# Altium schematic symbol library jlcpcb_2025_04_resistors_extended_2010.schlib: 1697 symbols (part 5 of 9) (continued)
## CR2010J20240G
designator R?  Resistance: 24Ω  (hidden comment: *)
Resistor, 24Ω, ±5%, 200V, SMD 2010; Manufacturer: Uniroyal; Manufacturer Part Number: CR2010J20240G; Supplier 1: LCSC; Supplier Part Number 1: C3037911; JLCPCB Part Number: C3037911; Category: Resistors; Package Size: 2010; JLCPCB Basic Part: Yes; Tolerance: ±5%; Voltage Rating: 200V; ComponentLink1Description: Datasheet; ComponentLink1URL: https://wmsc.lcsc.com/wmsc/upload/file/pdf/v2/lcsc/2206161815_LIZ-Elec-CR2010J20240G_C3037911.pdf; ComponentLink2Description: JLCPCB Part URL; ComponentLink2URL: https://jlcpcb.com/partdetail/C3037911
pins: 1, 2
1 alternate drawing of the same symbol

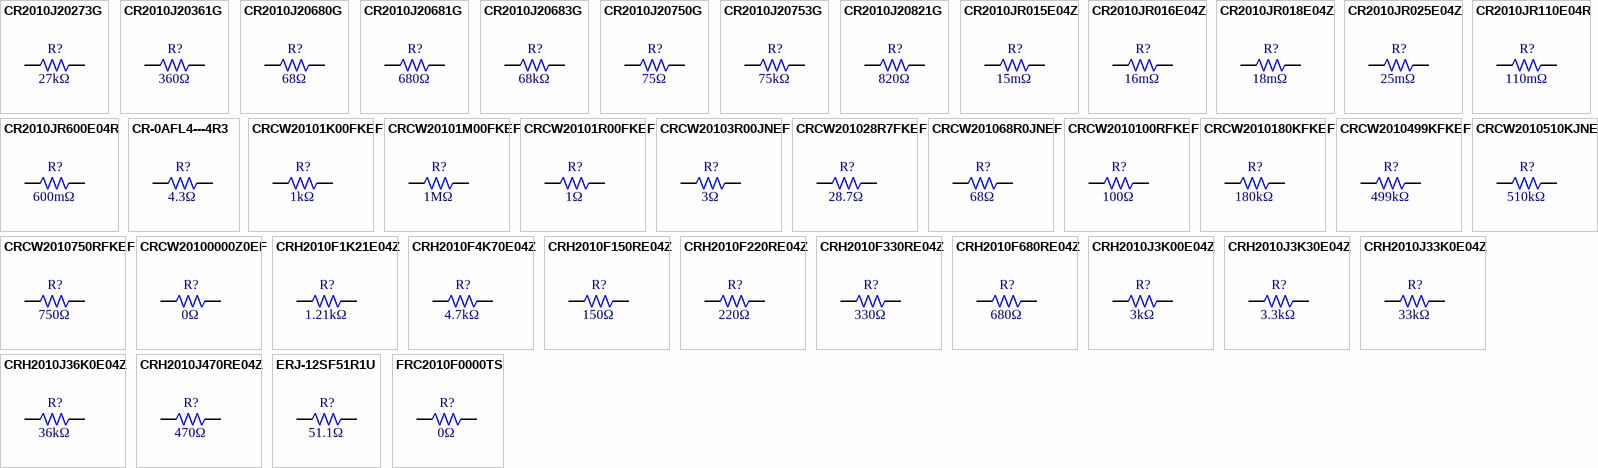
[diagram p22: symbols CR2010J20273G to FRC2010F0000TS]

## CR2010J20273G
designator R?  Resistance: 27kΩ  (hidden comment: *)
Resistor, 27kΩ, ±5%, 200V, SMD 2010; Manufacturer: Uniroyal; Manufacturer Part Number: CR2010J20273G; Supplier 1: LCSC; Supplier Part Number 1: C3036846; JLCPCB Part Number: C3036846; Category: Resistors; Package Size: 2010; JLCPCB Basic Part: Yes; Tolerance: ±5%; Voltage Rating: 200V; ComponentLink1Description: Datasheet; ComponentLink1URL: https://wmsc.lcsc.com/wmsc/upload/file/pdf/v2/lcsc/2206222045_LIZ-Elec-CR2010J20273G_C3036846.pdf; ComponentLink2Description: JLCPCB Part URL; ComponentLink2URL: https://jlcpcb.com/partdetail/C3036846
pins: 1, 2
1 alternate drawing of the same symbol

## CR2010J20361G
designator R?  Resistance: 360Ω  (hidden comment: *)
Resistor, 360Ω, ±5%, 200V, SMD 2010; Manufacturer: Uniroyal; Manufacturer Part Number: CR2010J20361G; Supplier 1: LCSC; Supplier Part Number 1: C3036878; JLCPCB Part Number: C3036878; Category: Resistors; Package Size: 2010; JLCPCB Basic Part: Yes; Tolerance: ±5%; Voltage Rating: 200V; ComponentLink1Description: Datasheet; ComponentLink1URL: https://wmsc.lcsc.com/wmsc/upload/file/pdf/v2/lcsc/2206301715_LIZ-Elec-CR2010J20361G_C3036878.pdf; ComponentLink2Description: JLCPCB Part URL; ComponentLink2URL: https://jlcpcb.com/partdetail/C3036878
pins: 1, 2
1 alternate drawing of the same symbol

## CR2010J20680G
designator R?  Resistance: 68Ω  (hidden comment: *)
Resistor, 68Ω, ±5%, 500mW, 200V, ±200ppm/℃, -55℃~+125℃, SMD 2010; Manufacturer: Uniroyal; Manufacturer Part Number: CR2010J20680G; Supplier 1: LCSC; Supplier Part Number 1: C102509; JLCPCB Part Number: C102509; Power Rating: 500mW; Category: Resistors; Package Size: 2010; JLCPCB Basic Part: Yes; Tolerance: ±5%; Voltage Rating: 200V; Temperature Coefficient: ±200ppm/℃; Temperature Rating: -55℃~+125℃; ComponentLink1Description: Datasheet; ComponentLink1URL: https://wmsc.lcsc.com/wmsc/upload/file/pdf/v2/lcsc/2304140030_LIZ-Elec-CR2010J20680G_C102509.pdf; ComponentLink2Description: JLCPCB Part URL; ComponentLink2URL: https://jlcpcb.com/partdetail/C102509
pins: 1, 2
1 alternate drawing of the same symbol

## CR2010J20681G
designator R?  Resistance: 680Ω  (hidden comment: *)
Resistor, 680Ω, ±5%, 500mW, 200V, ±200ppm/℃, -55℃~+125℃, SMD 2010; Manufacturer: Uniroyal; Manufacturer Part Number: CR2010J20681G; Supplier 1: LCSC; Supplier Part Number 1: C102510; JLCPCB Part Number: C102510; Power Rating: 500mW; Category: Resistors; Package Size: 2010; JLCPCB Basic Part: Yes; Tolerance: ±5%; Voltage Rating: 200V; Temperature Coefficient: ±200ppm/℃; Temperature Rating: -55℃~+125℃; ComponentLink1Description: Datasheet; ComponentLink1URL: https://wmsc.lcsc.com/wmsc/upload/file/pdf/v2/lcsc/2304140030_LIZ-Elec-CR2010J20681G_C102510.pdf; ComponentLink2Description: JLCPCB Part URL; ComponentLink2URL: https://jlcpcb.com/partdetail/C102510
pins: 1, 2
1 alternate drawing of the same symbol

## CR2010J20683G
designator R?  Resistance: 68kΩ  (hidden comment: *)
Resistor, 68kΩ, ±5%, 500mW, 200V, ±200ppm/℃, -55℃~+125℃, SMD 2010; Manufacturer: Uniroyal; Manufacturer Part Number: CR2010J20683G; Supplier 1: LCSC; Supplier Part Number 1: C102511; JLCPCB Part Number: C102511; Power Rating: 500mW; Category: Resistors; Package Size: 2010; JLCPCB Basic Part: Yes; Tolerance: ±5%; Voltage Rating: 200V; Temperature Coefficient: ±200ppm/℃; Temperature Rating: -55℃~+125℃; ComponentLink1Description: Datasheet; ComponentLink1URL: https://wmsc.lcsc.com/wmsc/upload/file/pdf/v2/lcsc/2304140030_LIZ-Elec-CR2010J20683G_C102511.pdf; ComponentLink2Description: JLCPCB Part URL; ComponentLink2URL: https://jlcpcb.com/partdetail/C102511
pins: 1, 2
1 alternate drawing of the same symbol

## CR2010J20750G
designator R?  Resistance: 75Ω  (hidden comment: *)
Resistor, 75Ω, ±5%, 500mW, 200V, ±200ppm/℃, -55℃~+125℃, SMD 2010; Manufacturer: Uniroyal; Manufacturer Part Number: CR2010J20750G; Supplier 1: LCSC; Supplier Part Number 1: C102512; JLCPCB Part Number: C102512; Power Rating: 500mW; Category: Resistors; Package Size: 2010; JLCPCB Basic Part: Yes; Tolerance: ±5%; Voltage Rating: 200V; Temperature Coefficient: ±200ppm/℃; Temperature Rating: -55℃~+125℃; ComponentLink1Description: Datasheet; ComponentLink1URL: https://wmsc.lcsc.com/wmsc/upload/file/pdf/v2/lcsc/2304140030_LIZ-Elec-CR2010J20750G_C102512.pdf; ComponentLink2Description: JLCPCB Part URL; ComponentLink2URL: https://jlcpcb.com/partdetail/C102512
pins: 1, 2
1 alternate drawing of the same symbol

## CR2010J20753G
designator R?  Resistance: 75kΩ  (hidden comment: *)
Resistor, 75kΩ, ±5%, 500mW, 200V, ±200ppm/℃, -55℃~+125℃, SMD 2010; Manufacturer: Uniroyal; Manufacturer Part Number: CR2010J20753G; Supplier 1: LCSC; Supplier Part Number 1: C102514; JLCPCB Part Number: C102514; Power Rating: 500mW; Category: Resistors; Package Size: 2010; JLCPCB Basic Part: Yes; Tolerance: ±5%; Voltage Rating: 200V; Temperature Coefficient: ±200ppm/℃; Temperature Rating: -55℃~+125℃; ComponentLink1Description: Datasheet; ComponentLink1URL: https://wmsc.lcsc.com/wmsc/upload/file/pdf/v2/lcsc/2304140030_LIZ-Elec-CR2010J20753G_C102514.pdf; ComponentLink2Description: JLCPCB Part URL; ComponentLink2URL: https://jlcpcb.com/partdetail/C102514
pins: 1, 2
1 alternate drawing of the same symbol

## CR2010J20821G
designator R?  Resistance: 820Ω  (hidden comment: *)
Resistor, 820Ω, ±5%, 500mW, 200V, ±200ppm/℃, -55℃~+125℃, SMD 2010; Manufacturer: Uniroyal; Manufacturer Part Number: CR2010J20821G; Supplier 1: LCSC; Supplier Part Number 1: C102516; JLCPCB Part Number: C102516; Power Rating: 500mW; Category: Resistors; Package Size: 2010; JLCPCB Basic Part: Yes; Tolerance: ±5%; Voltage Rating: 200V; Temperature Coefficient: ±200ppm/℃; Temperature Rating: -55℃~+125℃; ComponentLink1Description: Datasheet; ComponentLink1URL: https://wmsc.lcsc.com/wmsc/upload/file/pdf/v2/lcsc/2304140030_LIZ-Elec-CR2010J20821G_C102516.pdf; ComponentLink2Description: JLCPCB Part URL; ComponentLink2URL: https://jlcpcb.com/partdetail/C102516
pins: 1, 2
1 alternate drawing of the same symbol

## CR2010JR015E04Z
designator R?  Resistance: 15mΩ  (hidden comment: *)
Resistor, 15mΩ, ±5%, 750mW, 200V, -55℃~+155℃, SMD 2010; Manufacturer: Uniroyal; Manufacturer Part Number: CR2010JR015E04Z; Supplier 1: LCSC; Supplier Part Number 1: C165361; JLCPCB Part Number: C165361; Power Rating: 750mW; Category: Resistors; Package Size: 2010; JLCPCB Basic Part: Yes; Tolerance: ±5%; Voltage Rating: 200V; Temperature Rating: -55℃~+155℃; ComponentLink1Description: Datasheet; ComponentLink1URL: https://wmsc.lcsc.com/wmsc/upload/file/pdf/v2/lcsc/2304140030_Ever-Ohms-Tech-CR2010JR015E04Z_C165361.pdf; ComponentLink2Description: JLCPCB Part URL; ComponentLink2URL: https://jlcpcb.com/partdetail/C165361
pins: 1, 2
1 alternate drawing of the same symbol

## CR2010JR016E04Z
designator R?  Resistance: 16mΩ  (hidden comment: *)
Resistor, 16mΩ, ±5%, 750mW, 200V, -55℃~+155℃, SMD 2010; Manufacturer: Uniroyal; Manufacturer Part Number: CR2010JR016E04Z; Supplier 1: LCSC; Supplier Part Number 1: C165360; JLCPCB Part Number: C165360; Power Rating: 750mW; Category: Resistors; Package Size: 2010; JLCPCB Basic Part: Yes; Tolerance: ±5%; Voltage Rating: 200V; Temperature Rating: -55℃~+155℃; ComponentLink1Description: Datasheet; ComponentLink1URL: https://wmsc.lcsc.com/wmsc/upload/file/pdf/v2/lcsc/2304140030_Ever-Ohms-Tech-CR2010JR016E04Z_C165360.pdf; ComponentLink2Description: JLCPCB Part URL; ComponentLink2URL: https://jlcpcb.com/partdetail/C165360
pins: 1, 2
1 alternate drawing of the same symbol

## CR2010JR018E04Z
designator R?  Resistance: 18mΩ  (hidden comment: *)
Resistor, 18mΩ, ±5%, 750mW, 200V, -55℃~+155℃, SMD 2010; Manufacturer: Uniroyal; Manufacturer Part Number: CR2010JR018E04Z; Supplier 1: LCSC; Supplier Part Number 1: C165359; JLCPCB Part Number: C165359; Power Rating: 750mW; Category: Resistors; Package Size: 2010; JLCPCB Basic Part: Yes; Tolerance: ±5%; Voltage Rating: 200V; Temperature Rating: -55℃~+155℃; ComponentLink1Description: Datasheet; ComponentLink1URL: https://wmsc.lcsc.com/wmsc/upload/file/pdf/v2/lcsc/2304140030_Ever-Ohms-Tech-CR2010JR018E04Z_C165359.pdf; ComponentLink2Description: JLCPCB Part URL; ComponentLink2URL: https://jlcpcb.com/partdetail/C165359
pins: 1, 2
1 alternate drawing of the same symbol

## CR2010JR025E04Z
designator R?  Resistance: 25mΩ  (hidden comment: *)
Resistor, 25mΩ, ±5%, 750mW, 200V, -55℃~+155℃, SMD 2010; Manufacturer: Uniroyal; Manufacturer Part Number: CR2010JR025E04Z; Supplier 1: LCSC; Supplier Part Number 1: C165358; JLCPCB Part Number: C165358; Power Rating: 750mW; Category: Resistors; Package Size: 2010; JLCPCB Basic Part: Yes; Tolerance: ±5%; Voltage Rating: 200V; Temperature Rating: -55℃~+155℃; ComponentLink1Description: Datasheet; ComponentLink1URL: https://wmsc.lcsc.com/wmsc/upload/file/pdf/v2/lcsc/2304140030_Ever-Ohms-Tech-CR2010JR025E04Z_C165358.pdf; ComponentLink2Description: JLCPCB Part URL; ComponentLink2URL: https://jlcpcb.com/partdetail/C165358
pins: 1, 2
1 alternate drawing of the same symbol

## CR2010JR110E04R
designator R?  Resistance: 110mΩ  (hidden comment: *)
Resistor, 110mΩ, ±5%, 750mW, 200V, -55℃~+155℃, SMD 2010; Manufacturer: Uniroyal; Manufacturer Part Number: CR2010JR110E04R; Supplier 1: LCSC; Supplier Part Number 1: C165353; JLCPCB Part Number: C165353; Power Rating: 750mW; Category: Resistors; Package Size: 2010; JLCPCB Basic Part: Yes; Tolerance: ±5%; Voltage Rating: 200V; Temperature Rating: -55℃~+155℃; ComponentLink1Description: Datasheet; ComponentLink1URL: https://wmsc.lcsc.com/wmsc/upload/file/pdf/v2/lcsc/2304140030_Ever-Ohms-Tech-CR2010JR110E04R_C165353.pdf; ComponentLink2Description: JLCPCB Part URL; ComponentLink2URL: https://jlcpcb.com/partdetail/C165353
pins: 1, 2
1 alternate drawing of the same symbol

## CR2010JR600E04R
designator R?  Resistance: 600mΩ  (hidden comment: *)
Resistor, 600mΩ, ±5%, 750mW, 200V, -55℃~+155℃, SMD 2010; Manufacturer: Uniroyal; Manufacturer Part Number: CR2010JR600E04R; Supplier 1: LCSC; Supplier Part Number 1: C165349; JLCPCB Part Number: C165349; Power Rating: 750mW; Category: Resistors; Package Size: 2010; JLCPCB Basic Part: Yes; Tolerance: ±5%; Voltage Rating: 200V; Temperature Rating: -55℃~+155℃; ComponentLink1Description: Datasheet; ComponentLink1URL: https://wmsc.lcsc.com/wmsc/upload/file/pdf/v2/lcsc/2304140030_Ever-Ohms-Tech-CR2010JR600E04R_C165349.pdf; ComponentLink2Description: JLCPCB Part URL; ComponentLink2URL: https://jlcpcb.com/partdetail/C165349
pins: 1, 2
1 alternate drawing of the same symbol

## CR-0AFL4---4R3
designator R?  Resistance: 4.3Ω  (hidden comment: *)
Resistor, 4.3Ω, ±1%, 750mW, 200V, ±200ppm/℃, -55℃~+155℃, SMD 2010; Manufacturer: Uniroyal; Manufacturer Part Number: CR-0AFL4---4R3; Supplier 1: LCSC; Supplier Part Number 1: C468526; JLCPCB Part Number: C468526; Power Rating: 750mW; Category: Resistors; Package Size: 2010; JLCPCB Basic Part: Yes; Tolerance: ±1%; Voltage Rating: 200V; Temperature Coefficient: ±200ppm/℃; Temperature Rating: -55℃~+155℃; ComponentLink1Description: Datasheet; ComponentLink1URL: https://wmsc.lcsc.com/wmsc/upload/file/pdf/v2/lcsc/2304140030_Viking-Tech-CR-0AFL4---4R3_C468526.pdf; ComponentLink2Description: JLCPCB Part URL; ComponentLink2URL: https://jlcpcb.com/partdetail/C468526
pins: 1, 2
1 alternate drawing of the same symbol

## CRCW20101K00FKEF
designator R?  Resistance: 1kΩ  (hidden comment: *)
Resistor, 1kΩ, ±1%, 750mW, ±100ppm/℃, -55℃~+155℃, SMD 2010; Manufacturer: Uniroyal; Manufacturer Part Number: CRCW20101K00FKEF; Supplier 1: LCSC; Supplier Part Number 1: C844445; JLCPCB Part Number: C844445; Power Rating: 750mW; Category: Resistors; Package Size: 2010; JLCPCB Basic Part: Yes; Tolerance: ±1%; Temperature Coefficient: ±100ppm/℃; Temperature Rating: -55℃~+155℃; ComponentLink1Description: Datasheet; ComponentLink1URL: https://wmsc.lcsc.com/wmsc/upload/file/pdf/v2/lcsc/2210190530_Vishay-Intertech-CRCW20101K00FKEF_C844445.pdf; ComponentLink2Description: JLCPCB Part URL; ComponentLink2URL: https://jlcpcb.com/partdetail/C844445
pins: 1, 2
1 alternate drawing of the same symbol

## CRCW20101M00FKEF
designator R?  Resistance: 1MΩ  (hidden comment: *)
Resistor, 1MΩ, ±1%, 750mW, 400V, ±100ppm/℃, -55℃~+155℃, SMD 2010; Manufacturer: Uniroyal; Manufacturer Part Number: CRCW20101M00FKEF; Supplier 1: LCSC; Supplier Part Number 1: C2078608; JLCPCB Part Number: C2078608; Power Rating: 750mW; Category: Resistors; Package Size: 2010; JLCPCB Basic Part: Yes; Tolerance: ±1%; Voltage Rating: 400V; Temperature Coefficient: ±100ppm/℃; Temperature Rating: -55℃~+155℃; ComponentLink1Description: Datasheet; ComponentLink1URL: https://wmsc.lcsc.com/wmsc/upload/file/pdf/v2/lcsc/2304140030_Vishay-Intertech-CRCW20101M00FKEF_C2078608.pdf; ComponentLink2Description: JLCPCB Part URL; ComponentLink2URL: https://jlcpcb.com/partdetail/C2078608
pins: 1, 2
1 alternate drawing of the same symbol

## CRCW20101R00FKEF
designator R?  Resistance: 1Ω  (hidden comment: *)
Resistor, 1Ω, ±1%, 750mW, 300V, ±100ppm/℃, -55℃~+155℃, SMD 2010; Manufacturer: Uniroyal; Manufacturer Part Number: CRCW20101R00FKEF; Supplier 1: LCSC; Supplier Part Number 1: C2078776; JLCPCB Part Number: C2078776; Power Rating: 750mW; Category: Resistors; Package Size: 2010; JLCPCB Basic Part: Yes; Tolerance: ±1%; Voltage Rating: 300V; Temperature Coefficient: ±100ppm/℃; Temperature Rating: -55℃~+155℃; ComponentLink1Description: Datasheet; ComponentLink1URL: https://wmsc.lcsc.com/wmsc/upload/file/pdf/v2/lcsc/2304140030_Vishay-Intertech-CRCW20101R00FKEF_C2078776.pdf; ComponentLink2Description: JLCPCB Part URL; ComponentLink2URL: https://jlcpcb.com/partdetail/C2078776
pins: 1, 2
1 alternate drawing of the same symbol

## CRCW20103R00JNEF
designator R?  Resistance: 3Ω  (hidden comment: *)
Resistor, 3Ω, ±5%, 750mW, 400V, ±200ppm/℃, -55℃~+155℃, SMD 2010; Manufacturer: Uniroyal; Manufacturer Part Number: CRCW20103R00JNEF; Supplier 1: LCSC; Supplier Part Number 1: C2080716; JLCPCB Part Number: C2080716; Power Rating: 750mW; Category: Resistors; Package Size: 2010; JLCPCB Basic Part: Yes; Tolerance: ±5%; Voltage Rating: 400V; Temperature Coefficient: ±200ppm/℃; Temperature Rating: -55℃~+155℃; ComponentLink1Description: Datasheet; ComponentLink1URL: https://wmsc.lcsc.com/wmsc/upload/file/pdf/v2/lcsc/2304140030_Vishay-Intertech-CRCW20103R00JNEF_C2080716.pdf; ComponentLink2Description: JLCPCB Part URL; ComponentLink2URL: https://jlcpcb.com/partdetail/C2080716
pins: 1, 2
1 alternate drawing of the same symbol

## CRCW201028R7FKEF
designator R?  Resistance: 28.7Ω  (hidden comment: *)
Resistor, 28.7Ω, ±1%, 750mW, 300V, ±100ppm/℃, -55℃~+155℃, SMD 2010; Manufacturer: Uniroyal; Manufacturer Part Number: CRCW201028R7FKEF; Supplier 1: LCSC; Supplier Part Number 1: C2078433; JLCPCB Part Number: C2078433; Power Rating: 750mW; Category: Resistors; Package Size: 2010; JLCPCB Basic Part: Yes; Tolerance: ±1%; Voltage Rating: 300V; Temperature Coefficient: ±100ppm/℃; Temperature Rating: -55℃~+155℃; ComponentLink1Description: Datasheet; ComponentLink1URL: https://wmsc.lcsc.com/wmsc/upload/file/pdf/v2/lcsc/2304140030_Vishay-Intertech-CRCW201028R7FKEF_C2078433.pdf; ComponentLink2Description: JLCPCB Part URL; ComponentLink2URL: https://jlcpcb.com/partdetail/C2078433
pins: 1, 2
1 alternate drawing of the same symbol

## CRCW201068R0JNEF
designator R?  Resistance: 68Ω  (hidden comment: *)
Resistor, 68Ω, ±5%, 750mW, 400V, ±200ppm/℃, -55℃~+155℃, SMD 2010; Manufacturer: Uniroyal; Manufacturer Part Number: CRCW201068R0JNEF; Supplier 1: LCSC; Supplier Part Number 1: C2080727; JLCPCB Part Number: C2080727; Power Rating: 750mW; Category: Resistors; Package Size: 2010; JLCPCB Basic Part: Yes; Tolerance: ±5%; Voltage Rating: 400V; Temperature Coefficient: ±200ppm/℃; Temperature Rating: -55℃~+155℃; ComponentLink1Description: Datasheet; ComponentLink1URL: https://wmsc.lcsc.com/wmsc/upload/file/pdf/v2/lcsc/2304140030_Vishay-Intertech-CRCW201068R0JNEF_C2080727.pdf; ComponentLink2Description: JLCPCB Part URL; ComponentLink2URL: https://jlcpcb.com/partdetail/C2080727
pins: 1, 2
1 alternate drawing of the same symbol

## CRCW2010100RFKEF
designator R?  Resistance: 100Ω  (hidden comment: *)
Resistor, 100Ω, ±1%, 750mW, ±100ppm/℃, -55℃~+155℃, SMD 2010; Manufacturer: Uniroyal; Manufacturer Part Number: CRCW2010100RFKEF; Supplier 1: LCSC; Supplier Part Number 1: C844247; JLCPCB Part Number: C844247; Power Rating: 750mW; Category: Resistors; Package Size: 2010; JLCPCB Basic Part: Yes; Tolerance: ±1%; Temperature Coefficient: ±100ppm/℃; Temperature Rating: -55℃~+155℃; ComponentLink1Description: Datasheet; ComponentLink1URL: https://wmsc.lcsc.com/wmsc/upload/file/pdf/v2/lcsc/2210190530_Vishay-Intertech-CRCW2010100RFKEF_C844247.pdf; ComponentLink2Description: JLCPCB Part URL; ComponentLink2URL: https://jlcpcb.com/partdetail/C844247
pins: 1, 2
1 alternate drawing of the same symbol

## CRCW2010180KFKEF
designator R?  Resistance: 180kΩ  (hidden comment: *)
Resistor, 180kΩ, ±1%, 750mW, 400V, ±100ppm/K, -55℃~+155℃, SMD 2010; Manufacturer: Uniroyal; Manufacturer Part Number: CRCW2010180KFKEF; Supplier 1: LCSC; Supplier Part Number 1: C242564; JLCPCB Part Number: C242564; Power Rating: 750mW; Category: Resistors; Package Size: 2010; JLCPCB Basic Part: Yes; Tolerance: ±1%; Voltage Rating: 400V; Temperature Coefficient: ±100ppm/K; Temperature Rating: -55℃~+155℃; ComponentLink1Description: Datasheet; ComponentLink1URL: https://wmsc.lcsc.com/wmsc/upload/file/pdf/v2/lcsc/2304140030_Vishay-Intertech-CRCW2010180KFKEF_C242564.pdf; ComponentLink2Description: JLCPCB Part URL; ComponentLink2URL: https://jlcpcb.com/partdetail/C242564
pins: 1, 2
1 alternate drawing of the same symbol

## CRCW2010499KFKEF
designator R?  Resistance: 499kΩ  (hidden comment: *)
Resistor, 499kΩ, ±1%, 750mW, 300V, ±100ppm/℃, -55℃~+155℃, SMD 2010; Manufacturer: Uniroyal; Manufacturer Part Number: CRCW2010499KFKEF; Supplier 1: LCSC; Supplier Part Number 1: C2077941; JLCPCB Part Number: C2077941; Power Rating: 750mW; Category: Resistors; Package Size: 2010; JLCPCB Basic Part: Yes; Tolerance: ±1%; Voltage Rating: 300V; Temperature Coefficient: ±100ppm/℃; Temperature Rating: -55℃~+155℃; ComponentLink1Description: Datasheet; ComponentLink1URL: https://wmsc.lcsc.com/wmsc/upload/file/pdf/v2/lcsc/2304140030_Vishay-Intertech-CRCW2010499KFKEF_C2077941.pdf; ComponentLink2Description: JLCPCB Part URL; ComponentLink2URL: https://jlcpcb.com/partdetail/C2077941
pins: 1, 2
1 alternate drawing of the same symbol

## CRCW2010510KJNEF
designator R?  Resistance: 510kΩ  (hidden comment: *)
Resistor, 510kΩ, ±5%, 750mW, 300V, ±200ppm/℃, -55℃~+155℃, SMD 2010; Manufacturer: Uniroyal; Manufacturer Part Number: CRCW2010510KJNEF; Supplier 1: LCSC; Supplier Part Number 1: C2087116; JLCPCB Part Number: C2087116; Power Rating: 750mW; Category: Resistors; Package Size: 2010; JLCPCB Basic Part: Yes; Tolerance: ±5%; Voltage Rating: 300V; Temperature Coefficient: ±200ppm/℃; Temperature Rating: -55℃~+155℃; ComponentLink1Description: Datasheet; ComponentLink1URL: https://wmsc.lcsc.com/wmsc/upload/file/pdf/v2/lcsc/2304140030_Vishay-Intertech-CRCW2010510KJNEF_C2087116.pdf; ComponentLink2Description: JLCPCB Part URL; ComponentLink2URL: https://jlcpcb.com/partdetail/C2087116
pins: 1, 2
1 alternate drawing of the same symbol

## CRCW2010750RFKEF
designator R?  Resistance: 750Ω  (hidden comment: *)
Resistor, 750Ω, ±1%, 750mW, 300V, ±100ppm/℃, -55℃~+155℃, SMD 2010; Manufacturer: Uniroyal; Manufacturer Part Number: CRCW2010750RFKEF; Supplier 1: LCSC; Supplier Part Number 1: C2088372; JLCPCB Part Number: C2088372; Power Rating: 750mW; Category: Resistors; Package Size: 2010; JLCPCB Basic Part: Yes; Tolerance: ±1%; Voltage Rating: 300V; Temperature Coefficient: ±100ppm/℃; Temperature Rating: -55℃~+155℃; ComponentLink1Description: Datasheet; ComponentLink1URL: https://wmsc.lcsc.com/wmsc/upload/file/pdf/v2/lcsc/2304140030_Vishay-Intertech-CRCW2010750RFKEF_C2088372.pdf; ComponentLink2Description: JLCPCB Part URL; ComponentLink2URL: https://jlcpcb.com/partdetail/C2088372
pins: 1, 2
1 alternate drawing of the same symbol

## CRCW20100000Z0EF
designator R?  Resistance: 0Ω  (hidden comment: *)
Resistor, 0Ω, 750mW, -55℃~+155℃, SMD 2010; Manufacturer: Uniroyal; Manufacturer Part Number: CRCW20100000Z0EF; Supplier 1: LCSC; Supplier Part Number 1: C844882; JLCPCB Part Number: C844882; Power Rating: 750mW; Category: Resistors; Package Size: 2010; JLCPCB Basic Part: Yes; Temperature Rating: -55℃~+155℃; ComponentLink1Description: Datasheet; ComponentLink1URL: https://wmsc.lcsc.com/wmsc/upload/file/pdf/v2/lcsc/2312131902_Vishay-Intertech-CRCW20100000Z0EF_C844882.pdf; ComponentLink2Description: JLCPCB Part URL; ComponentLink2URL: https://jlcpcb.com/partdetail/C844882
pins: 1, 2
1 alternate drawing of the same symbol

## CRH2010F1K21E04Z
designator R?  Resistance: 1.21kΩ  (hidden comment: *)
Resistor, 1.21kΩ, ±1%, 1W, 200V, ±100ppm/℃, -55℃~+155℃, SMD 2010; Manufacturer: Uniroyal; Manufacturer Part Number: CRH2010F1K21E04Z; Supplier 1: LCSC; Supplier Part Number 1: C175054; JLCPCB Part Number: C175054; Power Rating: 1W; Category: Resistors; Package Size: 2010; JLCPCB Basic Part: Yes; Tolerance: ±1%; Voltage Rating: 200V; Temperature Coefficient: ±100ppm/℃; Temperature Rating: -55℃~+155℃; ComponentLink1Description: Datasheet; ComponentLink1URL: https://wmsc.lcsc.com/wmsc/upload/file/pdf/v2/lcsc/2304140030_Ever-Ohms-Tech-CRH2010F1K21E04Z_C175054.pdf; ComponentLink2Description: JLCPCB Part URL; ComponentLink2URL: https://jlcpcb.com/partdetail/C175054
pins: 1, 2
1 alternate drawing of the same symbol

## CRH2010F4K70E04Z
designator R?  Resistance: 4.7kΩ  (hidden comment: *)
Resistor, 4.7kΩ, ±1%, 1W, 200V, ±100ppm/℃, -55℃~+155℃, SMD 2010; Manufacturer: Uniroyal; Manufacturer Part Number: CRH2010F4K70E04Z; Supplier 1: LCSC; Supplier Part Number 1: C175073; JLCPCB Part Number: C175073; Power Rating: 1W; Category: Resistors; Package Size: 2010; JLCPCB Basic Part: Yes; Tolerance: ±1%; Voltage Rating: 200V; Temperature Coefficient: ±100ppm/℃; Temperature Rating: -55℃~+155℃; ComponentLink1Description: Datasheet; ComponentLink1URL: https://wmsc.lcsc.com/wmsc/upload/file/pdf/v2/lcsc/2304140030_Ever-Ohms-Tech-CRH2010F4K70E04Z_C175073.pdf; ComponentLink2Description: JLCPCB Part URL; ComponentLink2URL: https://jlcpcb.com/partdetail/C175073
pins: 1, 2
1 alternate drawing of the same symbol

## CRH2010F150RE04Z
designator R?  Resistance: 150Ω  (hidden comment: *)
Resistor, 150Ω, ±1%, 1W, 200V, ±100ppm/℃, -55℃~+155℃, SMD 2010; Manufacturer: Uniroyal; Manufacturer Part Number: CRH2010F150RE04Z; Supplier 1: LCSC; Supplier Part Number 1: C175014; JLCPCB Part Number: C175014; Power Rating: 1W; Category: Resistors; Package Size: 2010; JLCPCB Basic Part: Yes; Tolerance: ±1%; Voltage Rating: 200V; Temperature Coefficient: ±100ppm/℃; Temperature Rating: -55℃~+155℃; ComponentLink1Description: Datasheet; ComponentLink1URL: https://wmsc.lcsc.com/wmsc/upload/file/pdf/v2/lcsc/2304140030_Ever-Ohms-Tech-CRH2010F150RE04Z_C175014.pdf; ComponentLink2Description: JLCPCB Part URL; ComponentLink2URL: https://jlcpcb.com/partdetail/C175014
pins: 1, 2
1 alternate drawing of the same symbol

## CRH2010F220RE04Z
designator R?  Resistance: 220Ω  (hidden comment: *)
Resistor, 220Ω, ±1%, 1W, 200V, ±100ppm/℃, -55℃~+155℃, SMD 2010; Manufacturer: Uniroyal; Manufacturer Part Number: CRH2010F220RE04Z; Supplier 1: LCSC; Supplier Part Number 1: C175022; JLCPCB Part Number: C175022; Power Rating: 1W; Category: Resistors; Package Size: 2010; JLCPCB Basic Part: Yes; Tolerance: ±1%; Voltage Rating: 200V; Temperature Coefficient: ±100ppm/℃; Temperature Rating: -55℃~+155℃; ComponentLink1Description: Datasheet; ComponentLink1URL: https://wmsc.lcsc.com/wmsc/upload/file/pdf/v2/lcsc/2304140030_Ever-Ohms-Tech-CRH2010F220RE04Z_C175022.pdf; ComponentLink2Description: JLCPCB Part URL; ComponentLink2URL: https://jlcpcb.com/partdetail/C175022
pins: 1, 2
1 alternate drawing of the same symbol

## CRH2010F330RE04Z
designator R?  Resistance: 330Ω  (hidden comment: *)
Resistor, 330Ω, ±1%, 1W, 200V, ±100ppm/℃, -55℃~+155℃, SMD 2010; Manufacturer: Uniroyal; Manufacturer Part Number: CRH2010F330RE04Z; Supplier 1: LCSC; Supplier Part Number 1: C175030; JLCPCB Part Number: C175030; Power Rating: 1W; Category: Resistors; Package Size: 2010; JLCPCB Basic Part: Yes; Tolerance: ±1%; Voltage Rating: 200V; Temperature Coefficient: ±100ppm/℃; Temperature Rating: -55℃~+155℃; ComponentLink1Description: Datasheet; ComponentLink1URL: https://wmsc.lcsc.com/wmsc/upload/file/pdf/v2/lcsc/2304140030_Ever-Ohms-Tech-CRH2010F330RE04Z_C175030.pdf; ComponentLink2Description: JLCPCB Part URL; ComponentLink2URL: https://jlcpcb.com/partdetail/C175030
pins: 1, 2
1 alternate drawing of the same symbol

## CRH2010F680RE04Z
designator R?  Resistance: 680Ω  (hidden comment: *)
Resistor, 680Ω, ±1%, 1W, 200V, ±100ppm/℃, -55℃~+155℃, SMD 2010; Manufacturer: Uniroyal; Manufacturer Part Number: CRH2010F680RE04Z; Supplier 1: LCSC; Supplier Part Number 1: C175048; JLCPCB Part Number: C175048; Power Rating: 1W; Category: Resistors; Package Size: 2010; JLCPCB Basic Part: Yes; Tolerance: ±1%; Voltage Rating: 200V; Temperature Coefficient: ±100ppm/℃; Temperature Rating: -55℃~+155℃; ComponentLink1Description: Datasheet; ComponentLink1URL: https://wmsc.lcsc.com/wmsc/upload/file/pdf/v2/lcsc/2304140030_Ever-Ohms-Tech-CRH2010F680RE04Z_C175048.pdf; ComponentLink2Description: JLCPCB Part URL; ComponentLink2URL: https://jlcpcb.com/partdetail/C175048
pins: 1, 2
1 alternate drawing of the same symbol

## CRH2010J3K00E04Z
designator R?  Resistance: 3kΩ  (hidden comment: *)
Resistor, 3kΩ, ±5%, 1W, 200V, ±100ppm/℃, -55℃~+155℃, SMD 2010; Manufacturer: Uniroyal; Manufacturer Part Number: CRH2010J3K00E04Z; Supplier 1: LCSC; Supplier Part Number 1: C175168; JLCPCB Part Number: C175168; Power Rating: 1W; Category: Resistors; Package Size: 2010; JLCPCB Basic Part: Yes; Tolerance: ±5%; Voltage Rating: 200V; Temperature Coefficient: ±100ppm/℃; Temperature Rating: -55℃~+155℃; ComponentLink1Description: Datasheet; ComponentLink1URL: https://wmsc.lcsc.com/wmsc/upload/file/pdf/v2/lcsc/2304140030_Ever-Ohms-Tech-CRH2010J3K00E04Z_C175168.pdf; ComponentLink2Description: JLCPCB Part URL; ComponentLink2URL: https://jlcpcb.com/partdetail/C175168
pins: 1, 2
1 alternate drawing of the same symbol

## CRH2010J3K30E04Z
designator R?  Resistance: 3.3kΩ  (hidden comment: *)
Resistor, 3.3kΩ, ±5%, 1W, 200V, ±100ppm/℃, -55℃~+155℃, SMD 2010; Manufacturer: Uniroyal; Manufacturer Part Number: CRH2010J3K30E04Z; Supplier 1: LCSC; Supplier Part Number 1: C175169; JLCPCB Part Number: C175169; Power Rating: 1W; Category: Resistors; Package Size: 2010; JLCPCB Basic Part: Yes; Tolerance: ±5%; Voltage Rating: 200V; Temperature Coefficient: ±100ppm/℃; Temperature Rating: -55℃~+155℃; ComponentLink1Description: Datasheet; ComponentLink1URL: https://wmsc.lcsc.com/wmsc/upload/file/pdf/v2/lcsc/2304140030_Ever-Ohms-Tech-CRH2010J3K30E04Z_C175169.pdf; ComponentLink2Description: JLCPCB Part URL; ComponentLink2URL: https://jlcpcb.com/partdetail/C175169
pins: 1, 2
1 alternate drawing of the same symbol

## CRH2010J33K0E04Z
designator R?  Resistance: 33kΩ  (hidden comment: *)
Resistor, 33kΩ, ±5%, 1W, 200V, ±100ppm/℃, -55℃~+155℃, SMD 2010; Manufacturer: Uniroyal; Manufacturer Part Number: CRH2010J33K0E04Z; Supplier 1: LCSC; Supplier Part Number 1: C175179; JLCPCB Part Number: C175179; Power Rating: 1W; Category: Resistors; Package Size: 2010; JLCPCB Basic Part: Yes; Tolerance: ±5%; Voltage Rating: 200V; Temperature Coefficient: ±100ppm/℃; Temperature Rating: -55℃~+155℃; ComponentLink1Description: Datasheet; ComponentLink1URL: https://wmsc.lcsc.com/wmsc/upload/file/pdf/v2/lcsc/2304140030_Ever-Ohms-Tech-CRH2010J33K0E04Z_C175179.pdf; ComponentLink2Description: JLCPCB Part URL; ComponentLink2URL: https://jlcpcb.com/partdetail/C175179
pins: 1, 2
1 alternate drawing of the same symbol

## CRH2010J36K0E04Z
designator R?  Resistance: 36kΩ  (hidden comment: *)
Resistor, 36kΩ, ±5%, 1W, 200V, ±100ppm/℃, -55℃~+155℃, SMD 2010; Manufacturer: Uniroyal; Manufacturer Part Number: CRH2010J36K0E04Z; Supplier 1: LCSC; Supplier Part Number 1: C175180; JLCPCB Part Number: C175180; Power Rating: 1W; Category: Resistors; Package Size: 2010; JLCPCB Basic Part: Yes; Tolerance: ±5%; Voltage Rating: 200V; Temperature Coefficient: ±100ppm/℃; Temperature Rating: -55℃~+155℃; ComponentLink1Description: Datasheet; ComponentLink1URL: https://wmsc.lcsc.com/wmsc/upload/file/pdf/v2/lcsc/2304140030_Ever-Ohms-Tech-CRH2010J36K0E04Z_C175180.pdf; ComponentLink2Description: JLCPCB Part URL; ComponentLink2URL: https://jlcpcb.com/partdetail/C175180
pins: 1, 2
1 alternate drawing of the same symbol

## CRH2010J470RE04Z
designator R?  Resistance: 470Ω  (hidden comment: *)
Resistor, 470Ω, ±5%, 1W, 200V, ±100ppm/℃, -55℃~+155℃, SMD 2010; Manufacturer: Uniroyal; Manufacturer Part Number: CRH2010J470RE04Z; Supplier 1: LCSC; Supplier Part Number 1: C175159; JLCPCB Part Number: C175159; Power Rating: 1W; Category: Resistors; Package Size: 2010; JLCPCB Basic Part: Yes; Tolerance: ±5%; Voltage Rating: 200V; Temperature Coefficient: ±100ppm/℃; Temperature Rating: -55℃~+155℃; ComponentLink1Description: Datasheet; ComponentLink1URL: https://wmsc.lcsc.com/wmsc/upload/file/pdf/v2/lcsc/2304140030_Ever-Ohms-Tech-CRH2010J470RE04Z_C175159.pdf; ComponentLink2Description: JLCPCB Part URL; ComponentLink2URL: https://jlcpcb.com/partdetail/C175159
pins: 1, 2
1 alternate drawing of the same symbol

## ERJ-12SF51R1U
designator R?  Resistance: 51.1Ω  (hidden comment: *)
Resistor, 51.1Ω, ±1%, 750mW, 500V, ±100ppm/℃, -55℃~+155℃, SMD 2010; Manufacturer: Uniroyal; Manufacturer Part Number: ERJ-12SF51R1U; Supplier 1: LCSC; Supplier Part Number 1: C2080967; JLCPCB Part Number: C2080967; Power Rating: 750mW; Category: Resistors; Package Size: 2010; JLCPCB Basic Part: Yes; Tolerance: ±1%; Voltage Rating: 500V; Temperature Coefficient: ±100ppm/℃; Temperature Rating: -55℃~+155℃; ComponentLink1Description: Datasheet; ComponentLink1URL: https://wmsc.lcsc.com/wmsc/upload/file/pdf/v2/lcsc/2403291634_PANASONIC-ERJ-12SF51R1U_C2080967.pdf; ComponentLink2Description: JLCPCB Part URL; ComponentLink2URL: https://jlcpcb.com/partdetail/C2080967
pins: 1, 2
1 alternate drawing of the same symbol

## FRC2010F0000TS
designator R?  Resistance: 0Ω  (hidden comment: *)
Resistor, 0Ω, ±1%, 750mW, 200V, -55℃~+155℃, SMD 2010; Manufacturer: Uniroyal; Manufacturer Part Number: FRC2010F0000TS; Supplier 1: LCSC; Supplier Part Number 1: C2960848; JLCPCB Part Number: C2960848; Power Rating: 750mW; Category: Resistors; Package Size: 2010; JLCPCB Basic Part: Yes; Tolerance: ±1%; Voltage Rating: 200V; Temperature Rating: -55℃~+155℃; ComponentLink1Description: Datasheet; ComponentLink1URL: https://wmsc.lcsc.com/wmsc/upload/file/pdf/v2/lcsc/2308241947_FOJAN-FRC2010F0000TS_C2960848.pdf; ComponentLink2Description: JLCPCB Part URL; ComponentLink2URL: https://jlcpcb.com/partdetail/C2960848
pins: 1, 2
1 alternate drawing of the same symbol

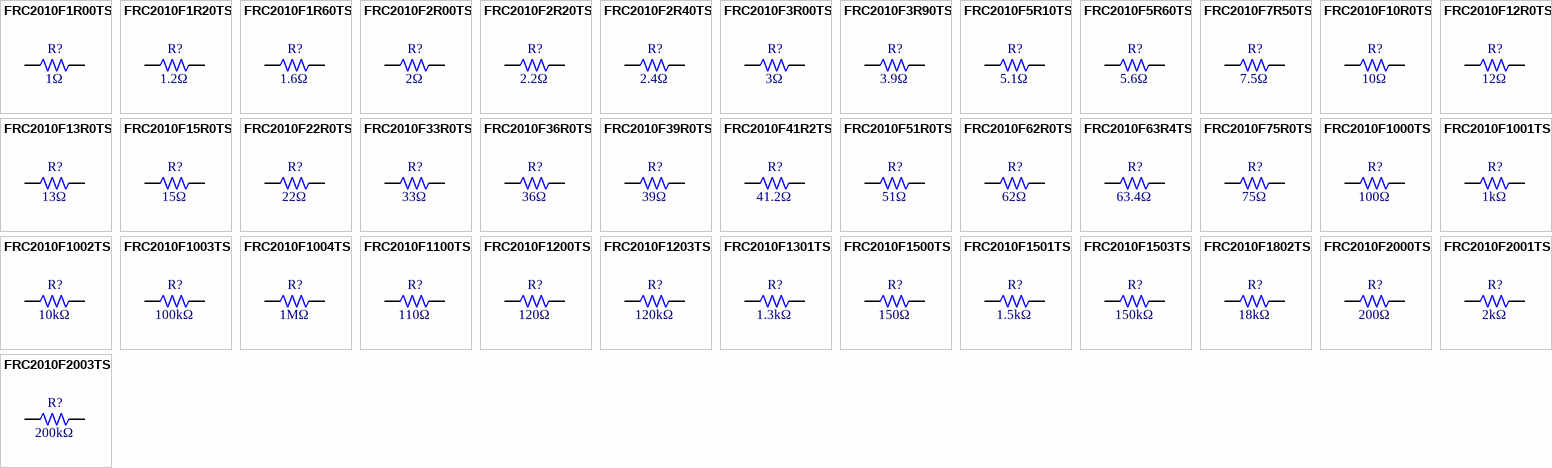
[diagram p23: symbols FRC2010F1R00TS to FRC2010F2003TS]

## FRC2010F1R00TS
designator R?  Resistance: 1Ω  (hidden comment: *)
Resistor, 1Ω, ±1%, 750mW, 200V, ±200ppm/℃, SMD 2010; Manufacturer: Uniroyal; Manufacturer Part Number: FRC2010F1R00TS; Supplier 1: LCSC; Supplier Part Number 1: C2999615; JLCPCB Part Number: C2999615; Power Rating: 750mW; Category: Resistors; Package Size: 2010; JLCPCB Basic Part: Yes; Tolerance: ±1%; Voltage Rating: 200V; Temperature Coefficient: ±200ppm/℃; ComponentLink1Description: Datasheet; ComponentLink1URL: https://wmsc.lcsc.com/wmsc/upload/file/pdf/v2/lcsc/2308241947_FOJAN-FRC2010F1R00TS_C2999615.pdf; ComponentLink2Description: JLCPCB Part URL; ComponentLink2URL: https://jlcpcb.com/partdetail/C2999615
pins: 1, 2
1 alternate drawing of the same symbol

## FRC2010F1R20TS
designator R?  Resistance: 1.2Ω  (hidden comment: *)
Resistor, 1.2Ω, ±1%, 750mW, 200V, ±200ppm/℃, -55℃~+155℃, SMD 2010; Manufacturer: Uniroyal; Manufacturer Part Number: FRC2010F1R20TS; Supplier 1: LCSC; Supplier Part Number 1: C2974093; JLCPCB Part Number: C2974093; Power Rating: 750mW; Category: Resistors; Package Size: 2010; JLCPCB Basic Part: Yes; Tolerance: ±1%; Voltage Rating: 200V; Temperature Coefficient: ±200ppm/℃; Temperature Rating: -55℃~+155℃; ComponentLink1Description: Datasheet; ComponentLink1URL: https://wmsc.lcsc.com/wmsc/upload/file/pdf/v2/lcsc/2202151130_FOJAN-FRC2010F1R20TS_C2974093.pdf; ComponentLink2Description: JLCPCB Part URL; ComponentLink2URL: https://jlcpcb.com/partdetail/C2974093
pins: 1, 2
1 alternate drawing of the same symbol

## FRC2010F1R60TS
designator R?  Resistance: 1.6Ω  (hidden comment: *)
Resistor, 1.6Ω, ±1%, 750mW, 200V, ±200ppm/℃, -55℃~+155℃, SMD 2010; Manufacturer: Uniroyal; Manufacturer Part Number: FRC2010F1R60TS; Supplier 1: LCSC; Supplier Part Number 1: C2974094; JLCPCB Part Number: C2974094; Power Rating: 750mW; Category: Resistors; Package Size: 2010; JLCPCB Basic Part: Yes; Tolerance: ±1%; Voltage Rating: 200V; Temperature Coefficient: ±200ppm/℃; Temperature Rating: -55℃~+155℃; ComponentLink1Description: Datasheet; ComponentLink1URL: https://wmsc.lcsc.com/wmsc/upload/file/pdf/v2/lcsc/2202151130_FOJAN-FRC2010F1R60TS_C2974094.pdf; ComponentLink2Description: JLCPCB Part URL; ComponentLink2URL: https://jlcpcb.com/partdetail/C2974094
pins: 1, 2
1 alternate drawing of the same symbol

## FRC2010F2R00TS
designator R?  Resistance: 2Ω  (hidden comment: *)
Resistor, 2Ω, ±1%, 750mW, 200V, ±200ppm/℃, -55℃~+155℃, SMD 2010; Manufacturer: Uniroyal; Manufacturer Part Number: FRC2010F2R00TS; Supplier 1: LCSC; Supplier Part Number 1: C2960923; JLCPCB Part Number: C2960923; Power Rating: 750mW; Category: Resistors; Package Size: 2010; JLCPCB Basic Part: Yes; Tolerance: ±1%; Voltage Rating: 200V; Temperature Coefficient: ±200ppm/℃; Temperature Rating: -55℃~+155℃; ComponentLink1Description: Datasheet; ComponentLink1URL: https://wmsc.lcsc.com/wmsc/upload/file/pdf/v2/lcsc/2308241947_FOJAN-FRC2010F2R00TS_C2960923.pdf; ComponentLink2Description: JLCPCB Part URL; ComponentLink2URL: https://jlcpcb.com/partdetail/C2960923
pins: 1, 2
1 alternate drawing of the same symbol

## FRC2010F2R20TS
designator R?  Resistance: 2.2Ω  (hidden comment: *)
Resistor, 2.2Ω, ±1%, 750mW, 200V, ±200ppm/℃, SMD 2010; Manufacturer: Uniroyal; Manufacturer Part Number: FRC2010F2R20TS; Supplier 1: LCSC; Supplier Part Number 1: C2999589; JLCPCB Part Number: C2999589; Power Rating: 750mW; Category: Resistors; Package Size: 2010; JLCPCB Basic Part: Yes; Tolerance: ±1%; Voltage Rating: 200V; Temperature Coefficient: ±200ppm/℃; ComponentLink1Description: Datasheet; ComponentLink1URL: https://wmsc.lcsc.com/wmsc/upload/file/pdf/v2/lcsc/2308241947_FOJAN-FRC2010F2R20TS_C2999589.pdf; ComponentLink2Description: JLCPCB Part URL; ComponentLink2URL: https://jlcpcb.com/partdetail/C2999589
pins: 1, 2
1 alternate drawing of the same symbol

## FRC2010F2R40TS
designator R?  Resistance: 2.4Ω  (hidden comment: *)
Resistor, 2.4Ω, ±1%, 750mW, 200V, ±200ppm/℃, -55℃~+155℃, SMD 2010; Manufacturer: Uniroyal; Manufacturer Part Number: FRC2010F2R40TS; Supplier 1: LCSC; Supplier Part Number 1: C2960849; JLCPCB Part Number: C2960849; Power Rating: 750mW; Category: Resistors; Package Size: 2010; JLCPCB Basic Part: Yes; Tolerance: ±1%; Voltage Rating: 200V; Temperature Coefficient: ±200ppm/℃; Temperature Rating: -55℃~+155℃; ComponentLink1Description: Datasheet; ComponentLink1URL: https://wmsc.lcsc.com/wmsc/upload/file/pdf/v2/lcsc/2308241947_FOJAN-FRC2010F2R40TS_C2960849.pdf; ComponentLink2Description: JLCPCB Part URL; ComponentLink2URL: https://jlcpcb.com/partdetail/C2960849
pins: 1, 2
1 alternate drawing of the same symbol

## FRC2010F3R00TS
designator R?  Resistance: 3Ω  (hidden comment: *)
Resistor, 3Ω, ±1%, 750mW, 200V, ±200ppm/℃, SMD 2010; Manufacturer: Uniroyal; Manufacturer Part Number: FRC2010F3R00TS; Supplier 1: LCSC; Supplier Part Number 1: C2999596; JLCPCB Part Number: C2999596; Power Rating: 750mW; Category: Resistors; Package Size: 2010; JLCPCB Basic Part: Yes; Tolerance: ±1%; Voltage Rating: 200V; Temperature Coefficient: ±200ppm/℃; ComponentLink1Description: Datasheet; ComponentLink1URL: https://wmsc.lcsc.com/wmsc/upload/file/pdf/v2/lcsc/2308241947_FOJAN-FRC2010F3R00TS_C2999596.pdf; ComponentLink2Description: JLCPCB Part URL; ComponentLink2URL: https://jlcpcb.com/partdetail/C2999596
pins: 1, 2
1 alternate drawing of the same symbol
